# Altium footprint library m-BLANC.PcbLib: 53 footprints (part 2 of 4)
Each footprint in its own frame and in the unit in brackets; x right, y up, seen from the top. Pads: shape width x height; smd on the part's side, far side on the other; paste and mask are expansions set on the pad; w line width, h text height; cw(c..) or ccw(c..) is an arc to the next point about the centre after c.
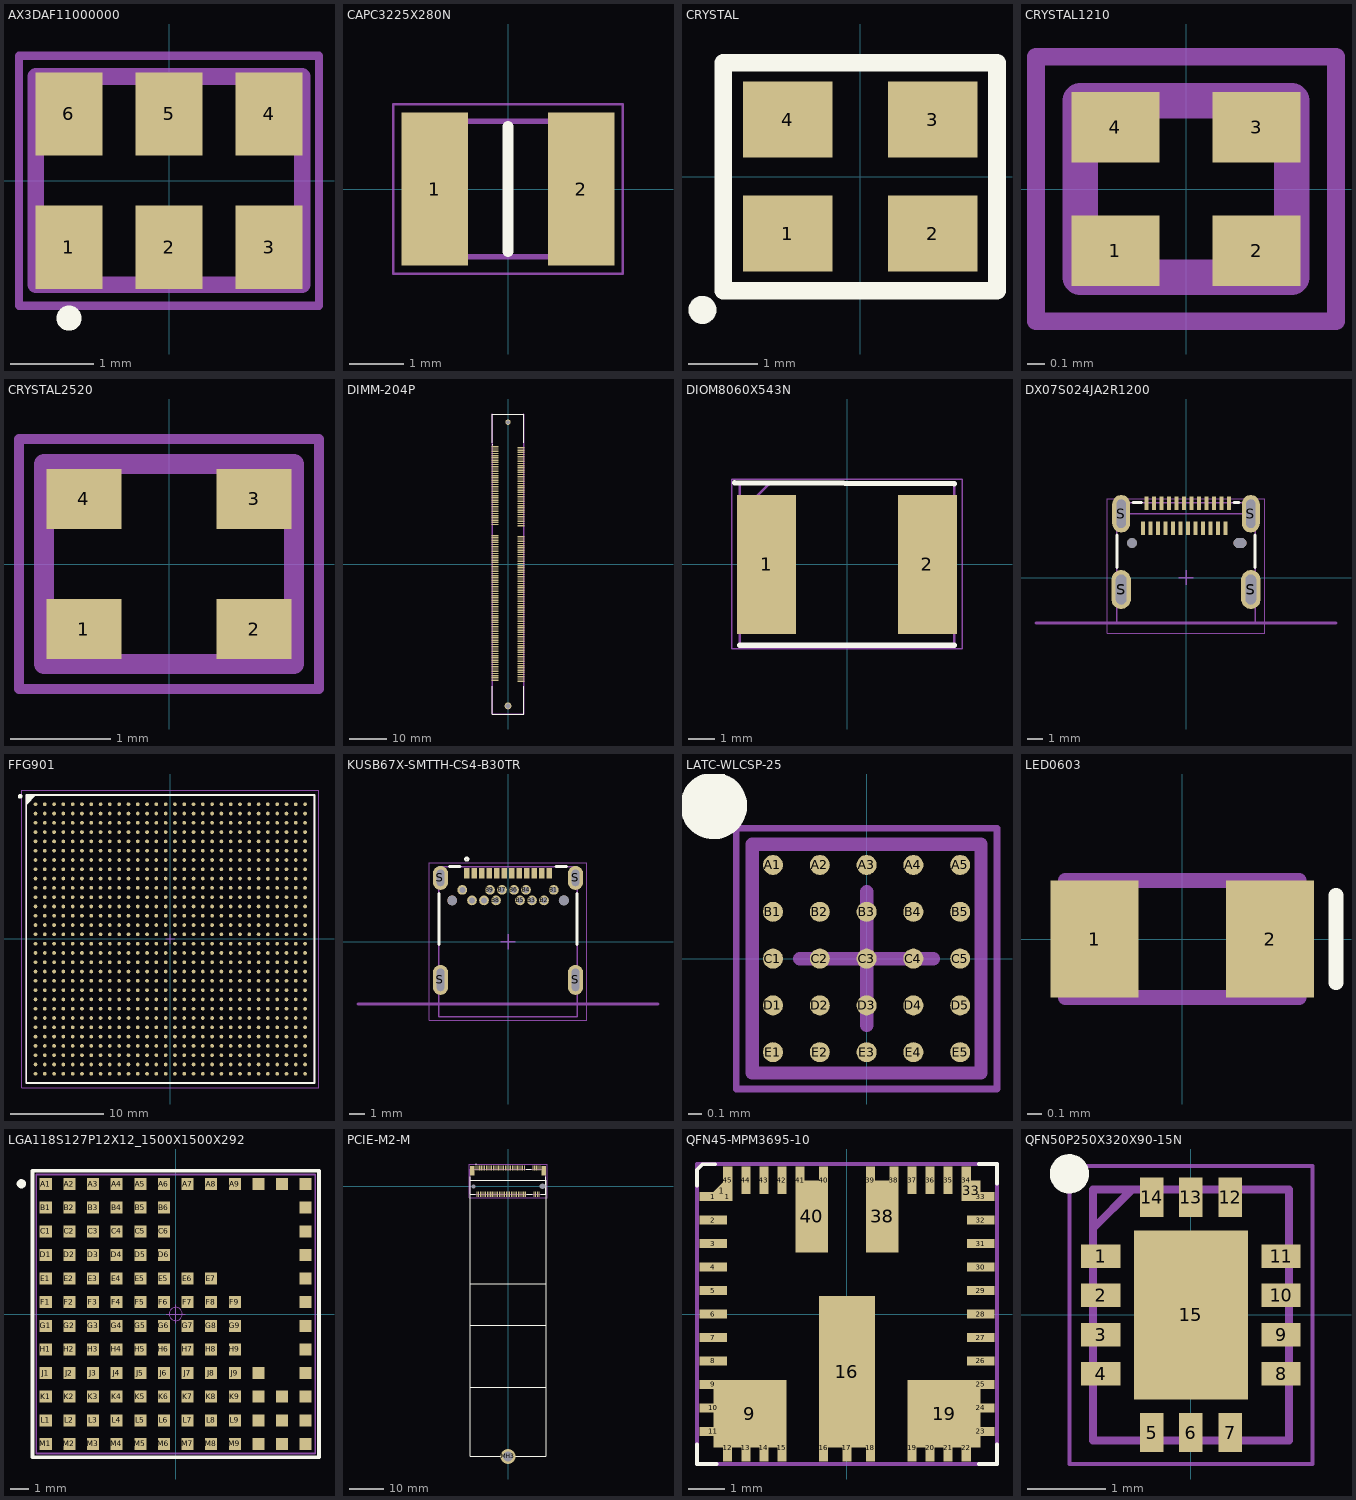
[diagram p1: the footprints below, top view; thin cyan lines are the x and y axes]

## AX3DAF11000000 [mm]
pads (6):
  rect 0.8x1 smd: 1(-1.2,-0.8) 2(0,-0.8) 3(1.2,-0.8) 4(1.2,0.8) 5(0,0.8) 6(-1.2,0.8)
Top Overlay:
  lines w0.2: -1.2,-1.7 ccw(c-1.2,-1.65) -1.2,-1.6 ccw(c-1.2,-1.65) -1.2,-1.7
Mechanical 13:
  lines w0.2: -1.6,-1.25 -1.6,1.25 1.6,1.25 1.6,-1.25 -1.6,-1.25
Mechanical 15:
  lines w0.1: -1.8,-1.5 -1.8,1.5 1.8,1.5 1.8,-1.5 -1.8,-1.5
3D body "AX3DAF1-100.0000.stp": height 1.2, standoff 0, extent -1.6,-1.26 1.6,1.26

## CAPC3225X280N [mm]
pads (2):
  rect 1.22x2.82 smd: 1(-1.35,0) 2(1.35,0)
Top Overlay:
  lines w0.2: 0,-1.15 0,1.15
Mechanical 13:
  lines w0.1: -1.6,-1.25 -1.6,1.25 1.6,1.25 1.6,-1.25 -1.6,-1.25
Mechanical 15:
  lines w0.05: -2.11,-1.56 -2.11,1.56 2.11,1.56 2.11,-1.56 -2.11,-1.56
3D body "JMK325ABJ107MM-P.stp": height 2.8, standoff 0, extent -1.6,-1.25 1.6,1.25

## CRYSTAL [mm]
pads (4):
  rect 1.3x1.1 smd: 1(-1.05,-0.825) 2(1.05,-0.825) 3(1.05,0.825) 4(-1.05,0.825)
Top Overlay:
  circle w0.25: c-2.286,-1.93 r0.078
  lines w0.254: -1.981,-1.65 -1.981,1.651 1.981,1.651 1.981,-1.65 -1.981,-1.65
3D body "ASE.STEP": height 1.2, standoff 0, extent -1.6,-1.25 1.6,1.25

## CRYSTAL1210 [mm]
pads (4):
  rect 0.5x0.4 smd: 1(-0.4,-0.35) 2(0.4,-0.35) 3(0.4,0.35) 4(-0.4,0.35)
Mechanical 13:
  lines w0.2: -0.6,-0.5 0.6,-0.5 0.6,0.5 -0.6,0.5 -0.6,-0.5
Mechanical 15:
  lines w0.1: -0.85,-0.75 0.85,-0.75 0.85,0.75 -0.85,0.75 -0.85,-0.75
3D body "ABM13W-52.0000MHZ-5-B2G-T5.stp": height 0.5, standoff 0, extent -0.61,-0.51 0.61,0.51

## CRYSTAL2520 [mm]
pads (4):
  rect 0.75x0.6 smd: 1(-0.85,-0.65) 2(0.85,-0.65) 3(0.85,0.65) 4(-0.85,0.65)
Mechanical 13:
  lines w0.2: -1.25,-1 -1.25,1 1.25,1 1.25,-1 -1.25,-1
Mechanical 15:
  lines w0.1: -1.5,-1.25 -1.5,1.25 1.5,1.25 1.5,-1.25 -1.5,-1.25
3D body: height 0.5, standoff 0, extent -1.25,-1 1.25,1

## DIMM-204P [mm]
pads (206):
  rect 2x0.35 smd: 1(-3.5,31.65) 2(3.5,31.35) 3(3.5,30.75) 4(-3.5,31.05) 5(3.5,30.15) 6(-3.5,30.45) 7(3.5,29.55) 8(-3.5,29.85) 9(3.5,28.95) 10(-3.5,29.25) 11(3.5,28.35) 12(-3.5,28.65) 13(3.5,27.75) 14(-3.5,28.05) 15(3.5,27.15) 16(-3.5,27.45) 17(3.5,26.55) 18(-3.5,26.85) 19(3.5,25.95) 20(-3.5,26.25) 21(3.5,25.35) 22(-3.5,25.65) 23(3.5,24.75) 24(-3.5,25.05) 25(3.5,24.15) 26(-3.5,24.45) 27(3.5,23.55) 28(-3.5,23.85) 29(3.5,22.95) 30(-3.5,23.25) 31(3.5,22.35) 32(-3.5,22.65) 33(3.5,21.75) 34(-3.5,22.05) 35(3.5,21.15) 36(-3.5,21.45) 37(3.5,20.55) 38(-3.5,20.85) 39(3.5,19.95) 40(-3.5,20.25) 41(3.5,19.35) 42(-3.5,19.65) 43(3.5,18.75) 44(-3.5,19.05) 45(3.5,18.15) 46(-3.5,18.45) 47(3.5,17.55) 48(-3.5,17.85) 49(3.5,16.95) 50(-3.5,17.25) 51(3.5,16.35) 52(-3.5,16.65) 53(3.5,15.75) 54(-3.5,16.05) 55(3.5,15.15) 56(-3.5,15.45) 57(3.5,14.55) 58(-3.5,14.85) 59(3.5,13.95) 60(-3.5,14.25) 61(3.5,13.35) 62(-3.5,13.65) 63(3.5,12.75) 64(-3.5,13.05) 65(3.5,12.15) 66(-3.5,12.45) 67(3.5,11.55) 68(-3.5,11.85) 69(3.5,10.95) 70(-3.5,11.25) 71(3.5,10.35) 72(-3.5,10.65) 73(-3.5,7.65) 74(3.5,7.35) 75(-3.5,7.05) 76(3.5,6.75) 77(-3.5,6.45) 78(3.5,6.15) 79(-3.5,5.85) 80(3.5,5.55) 81(-3.5,5.25) 82(3.5,4.95) 83(-3.5,4.65) 84(3.5,4.35) 85(-3.5,4.05) 86(3.5,3.75) 87(-3.5,3.45) 88(3.5,3.15) 89(-3.5,2.85) 90(3.5,2.55) 91(-3.5,2.25) 92(3.5,1.95) 93(-3.5,1.65) 94(3.5,1.35) 95(-3.5,1.05) 96(3.5,0.75) 97(-3.5,0.45) 98(3.5,0.15) 99(-3.5,-0.15) 100(3.5,-0.45) 101(-3.5,-0.75) 102(3.5,-1.05) 103(-3.5,-1.35) 104(3.5,-1.65) 105(-3.5,-1.95) 106(3.5,-2.25) 107(-3.5,-2.55) 108(3.5,-2.85) 109(-3.5,-3.15) 110(3.5,-3.45) 111(-3.5,-3.75) 112(3.5,-4.05) 113(-3.5,-4.35) 114(3.5,-4.65) 115(-3.5,-4.95) 116(3.5,-5.25) 117(-3.5,-5.55) 118(3.5,-5.85) 119(-3.5,-6.15) 120(3.5,-6.45) 121(-3.5,-6.75) 122(3.5,-7.05) 123(-3.5,-7.35) 124(3.5,-7.65) 125(-3.5,-7.95) 126(3.5,-8.25) 127(-3.5,-8.55) 128(3.5,-8.85) 129(-3.5,-9.15) 130(3.5,-9.45) 131(-3.5,-9.75) 132(3.5,-10.05) 133(-3.5,-10.35) 134(3.5,-10.65) 135(-3.5,-10.95) 136(3.5,-11.25) 137(-3.5,-11.55) 138(3.5,-11.85) 139(-3.5,-12.15) 140(3.5,-12.45) 141(-3.5,-12.75) 142(3.5,-13.05) 143(-3.5,-13.35) 144(3.5,-13.65) 145(-3.5,-13.95) 146(3.5,-14.25) 147(-3.5,-14.55) 148(3.5,-14.85) 149(-3.5,-15.15) 150(3.5,-15.45) 151(-3.5,-15.75) 152(3.5,-16.05) 153(-3.5,-16.35) 154(3.5,-16.65) 155(-3.5,-16.95) 156(3.5,-17.25) 157(-3.5,-17.55) 158(3.5,-17.85) 159(-3.5,-18.15) 160(3.5,-18.45) 161(-3.5,-18.75) 162(3.5,-19.05) 163(-3.5,-19.35) 164(3.5,-19.65) 165(-3.5,-19.95) 166(3.5,-20.25) 167(-3.5,-20.55) 168(3.5,-20.85) 169(-3.5,-21.15) 170(3.5,-21.45) 171(-3.5,-21.75) 172(3.5,-22.05) 173(-3.5,-22.35) 174(3.5,-22.65) 175(-3.5,-22.95) 176(3.5,-23.25) 177(-3.5,-23.55) 178(3.5,-23.85) 179(-3.5,-24.15) 180(3.5,-24.45) 181(-3.5,-24.75) 182(3.5,-25.05) 183(-3.5,-25.35) 184(3.5,-25.65) 185(-3.5,-25.95) 186(3.5,-26.25) 187(-3.5,-26.55) 188(3.5,-26.85) 189(-3.5,-27.15) 190(3.5,-27.45) 191(-3.5,-27.75) 192(3.5,-28.05) 193(-3.5,-28.35) 194(3.5,-28.65) 195(-3.5,-28.95) 196(3.5,-29.25) 197(-3.5,-29.55) 198(3.5,-29.85) 199(-3.5,-30.15) 200(3.5,-30.45) 201(-3.5,-30.75) 202(3.5,-31.05) 203(-3.5,-31.35) 204(3.5,-31.65)
  round 1.45 hole 1: MH1(0,38.3)
  round 1.85 hole 1.4: MH2(0,-38.3)
Top Overlay:
  circle w0.1: c-4.195,32.208 r0.05
  lines w0.1: -4.203,32.8 -4.203,40.5 4.2,40.5 ; -4.199,-33.02 -4.199,-40.5 4.2,-40.5 ; 4.197,32.8 4.197,40.5 ; 4.201,-40.5 4.201,-33.02
Mechanical 13:
  lines w0.1: -4.2,-40.5 4.2,-40.5 4.2,40.5 -4.2,40.5 -4.2,-40.5
Mechanical 15:
  lines w0.1: -4.2,-40.5 -4.2,40.5 4.2,40.5 4.2,-40.5 -4.2,-40.5
3D body: height 4, standoff 0, extent -4.25,-40.55 4.25,40.55

## DIOM8060X543N [mm]
pads (2):
  rect 2.2x5.2 smd: 1(-3,0) 2(3,0)
Top Overlay:
  lines w0.2: -4.2,3.05 4.008,3.012 ; -4.008,-3.012 4.008,-3.012
Mechanical 13:
  lines w0.1: -4.008,1.912 -2.908,3.012 ; -4.008,-3.012 4.008,-3.012 4.008,3.012 -4.008,3.012 -4.008,-3.012
Mechanical 15:
  lines w0.05: -4.3,-3.15 4.3,-3.15 4.3,3.185 -4.3,3.185 -4.3,-3.15
3D body "SK106-TP.stp": height 5.43, standoff 0, extent -4.008,-3.013 4.008,3.013

## DX07S024JA2R1200 [mm] "Micro USB Receptacle, Type C, Hybrid Type, PCB Top Mount"
height 3.42
pads (30):
  rect 0.25x0.9 smd: A1(-2.628,4.942) A2(-2.128,4.942) A3(-1.628,4.942) A4(-1.128,4.942) A5(-0.628,4.942) A6(-0.128,4.942) A7(0.372,4.942) A8(0.872,4.942) A9(1.372,4.942) A10(1.872,4.942) A11(2.372,4.942) A12(2.872,4.942) B1(2.625,3.297) B2(2.125,3.297) B3(1.625,3.297) B4(1.125,3.297) B5(0.625,3.297) B6(0.125,3.297) B7(-0.375,3.297) B8(-0.875,3.297) B9(-1.375,3.297) B10(-1.875,3.297) B11(-2.375,3.297) B12(-2.875,3.297)
  oval 1.3x2.6 hole 0.7 slot 2 at 90 deg: S(-4.32,-0.8) S(4.32,-0.8)
  oval 1.2x2.5 hole 0.6 slot 1.9 at 90 deg: S(-4.32,4.25) S(4.32,4.25)
  round 0.65 hole 0.65 unplated: ""(-3.6,2.3)
  oval 0.85x0.65 hole 0.65 slot 0.85 at 0 deg unplated: ""(3.6,2.3)
Top Overlay:
  lines w0.2: -4.6,2.85 -4.598,0.657 ; -3.525,5 -2.958,5 ; 3.2,5 3.526,5 ; 4.6,0.662 4.6,2.848
Mechanical 1:
  lines w0.1: -4.32,4.25 4.32,4.25
  lines w0.2: -10,-3.05 10,-3.05
  text "PCB Edge" at -2.05,-2.6 h0.5
Mechanical 13:
  lines w0.1: -4.6,-3.05 -4.6,5 4.6,5 4.6,-3.05
Mechanical 15:
  lines w0.05: -5.25,-3.7 5.25,-3.7 5.25,5.25 -5.25,5.25 -5.25,-3.7
  lines w0.1: -0.5,0 0.5,0 ; 0,-0.5 0,0.5
3D body "K3D-DX07S024JA2-V1_JAE_Proprietary.STEP": height 3.17, standoff -1.17, extent -4.47,-3.1 4.47,5.07

## FFG901 [mm] "BGA, 900-Balls, Body 31x31mm, Pitch 1mm"
height 3.35
pads (900):
  round 0.4 smd: A1(-14.5,14.5) A2(-13.5,14.5) A3(-12.5,14.5) A4(-11.5,14.5) A5(-10.5,14.5) A6(-9.5,14.5) A7(-8.5,14.5) A8(-7.5,14.5) A9(-6.5,14.5) A10(-5.5,14.5) A11(-4.5,14.5) A12(-3.5,14.5) A13(-2.5,14.5) A14(-1.5,14.5) A15(-0.5,14.5) A16(0.5,14.5) A17(1.5,14.5) A18(2.5,14.5) A19(3.5,14.5) A20(4.5,14.5) A21(5.5,14.5) A22(6.5,14.5) A23(7.5,14.5) A24(8.5,14.5) A25(9.5,14.5) A26(10.5,14.5) A27(11.5,14.5) A28(12.5,14.5) A29(13.5,14.5) A30(14.5,14.5) AA1(-14.5,-5.5) AA2(-13.5,-5.5) AA3(-12.5,-5.5) AA4(-11.5,-5.5) AA5(-10.5,-5.5) AA6(-9.5,-5.5) AA7(-8.5,-5.5) AA8(-7.5,-5.5) AA9(-6.5,-5.5) AA10(-5.5,-5.5) AA11(-4.5,-5.5) AA12(-3.5,-5.5) AA13(-2.5,-5.5) AA14(-1.5,-5.5) AA15(-0.5,-5.5) AA16(0.5,-5.5) AA17(1.5,-5.5) AA18(2.5,-5.5) AA19(3.5,-5.5) AA20(4.5,-5.5) AA21(5.5,-5.5) AA22(6.5,-5.5) AA23(7.5,-5.5) AA24(8.5,-5.5) AA25(9.5,-5.5) AA26(10.5,-5.5) AA27(11.5,-5.5) AA28(12.5,-5.5) AA29(13.5,-5.5) AA30(14.5,-5.5) AB1(-14.5,-6.5) AB2(-13.5,-6.5) AB3(-12.5,-6.5) AB4(-11.5,-6.5) AB5(-10.5,-6.5) AB6(-9.5,-6.5) AB7(-8.5,-6.5) AB8(-7.5,-6.5) AB9(-6.5,-6.5) AB10(-5.5,-6.5) AB11(-4.5,-6.5) AB12(-3.5,-6.5) AB13(-2.5,-6.5) AB14(-1.5,-6.5) AB15(-0.5,-6.5) AB16(0.5,-6.5) AB17(1.5,-6.5) AB18(2.5,-6.5) AB19(3.5,-6.5) AB20(4.5,-6.5) AB21(5.5,-6.5) AB22(6.5,-6.5) AB23(7.5,-6.5) AB24(8.5,-6.5) AB25(9.5,-6.5) AB26(10.5,-6.5) AB27(11.5,-6.5) AB28(12.5,-6.5) AB29(13.5,-6.5) AB30(14.5,-6.5) AC1(-14.5,-7.5) AC2(-13.5,-7.5) AC3(-12.5,-7.5) AC4(-11.5,-7.5) AC5(-10.5,-7.5) AC6(-9.5,-7.5) AC7(-8.5,-7.5) AC8(-7.5,-7.5) AC9(-6.5,-7.5) AC10(-5.5,-7.5) AC11(-4.5,-7.5) AC12(-3.5,-7.5) AC13(-2.5,-7.5) AC14(-1.5,-7.5) AC15(-0.5,-7.5) AC16(0.5,-7.5) AC17(1.5,-7.5) AC18(2.5,-7.5) AC19(3.5,-7.5) AC20(4.5,-7.5) AC21(5.5,-7.5) AC22(6.5,-7.5) AC23(7.5,-7.5) AC24(8.5,-7.5) AC25(9.5,-7.5) AC26(10.5,-7.5) AC27(11.5,-7.5) AC28(12.5,-7.5) AC29(13.5,-7.5) AC30(14.5,-7.5) AD1(-14.5,-8.5) AD2(-13.5,-8.5) AD3(-12.5,-8.5) AD4(-11.5,-8.5) AD5(-10.5,-8.5) AD6(-9.5,-8.5) AD7(-8.5,-8.5) AD8(-7.5,-8.5) AD9(-6.5,-8.5) AD10(-5.5,-8.5) AD11(-4.5,-8.5) AD12(-3.5,-8.5) AD13(-2.5,-8.5) AD14(-1.5,-8.5) AD15(-0.5,-8.5) AD16(0.5,-8.5) AD17(1.5,-8.5) AD18(2.5,-8.5) AD19(3.5,-8.5) AD20(4.5,-8.5) AD21(5.5,-8.5) AD22(6.5,-8.5) AD23(7.5,-8.5) AD24(8.5,-8.5) AD25(9.5,-8.5) AD26(10.5,-8.5) AD27(11.5,-8.5) AD28(12.5,-8.5) AD29(13.5,-8.5) AD30(14.5,-8.5) AE1(-14.5,-9.5) AE2(-13.5,-9.5) AE3(-12.5,-9.5) AE4(-11.5,-9.5) AE5(-10.5,-9.5) AE6(-9.5,-9.5) AE7(-8.5,-9.5) AE8(-7.5,-9.5) AE9(-6.5,-9.5) AE10(-5.5,-9.5) AE11(-4.5,-9.5) AE12(-3.5,-9.5) AE13(-2.5,-9.5) AE14(-1.5,-9.5) AE15(-0.5,-9.5) AE16(0.5,-9.5) AE17(1.5,-9.5) AE18(2.5,-9.5) AE19(3.5,-9.5) AE20(4.5,-9.5) AE21(5.5,-9.5) AE22(6.5,-9.5) AE23(7.5,-9.5) AE24(8.5,-9.5) AE25(9.5,-9.5) AE26(10.5,-9.5) AE27(11.5,-9.5) AE28(12.5,-9.5) AE29(13.5,-9.5) AE30(14.5,-9.5) AF1(-14.5,-10.5) AF2(-13.5,-10.5) AF3(-12.5,-10.5) AF4(-11.5,-10.5) AF5(-10.5,-10.5) AF6(-9.5,-10.5) AF7(-8.5,-10.5) AF8(-7.5,-10.5) AF9(-6.5,-10.5) AF10(-5.5,-10.5) AF11(-4.5,-10.5) AF12(-3.5,-10.5) AF13(-2.5,-10.5) AF14(-1.5,-10.5) AF15(-0.5,-10.5) AF16(0.5,-10.5) AF17(1.5,-10.5) AF18(2.5,-10.5) AF19(3.5,-10.5) AF20(4.5,-10.5) AF21(5.5,-10.5) AF22(6.5,-10.5) AF23(7.5,-10.5) AF24(8.5,-10.5) AF25(9.5,-10.5) AF26(10.5,-10.5) AF27(11.5,-10.5) AF28(12.5,-10.5) AF29(13.5,-10.5) AF30(14.5,-10.5) AG1(-14.5,-11.5) AG2(-13.5,-11.5) AG3(-12.5,-11.5) AG4(-11.5,-11.5) AG5(-10.5,-11.5) AG6(-9.5,-11.5) AG7(-8.5,-11.5) AG8(-7.5,-11.5) AG9(-6.5,-11.5) AG10(-5.5,-11.5) AG11(-4.5,-11.5) AG12(-3.5,-11.5) AG13(-2.5,-11.5) AG14(-1.5,-11.5) AG15(-0.5,-11.5) AG16(0.5,-11.5) AG17(1.5,-11.5) AG18(2.5,-11.5) AG19(3.5,-11.5) AG20(4.5,-11.5) AG21(5.5,-11.5) AG22(6.5,-11.5) AG23(7.5,-11.5) AG24(8.5,-11.5) AG25(9.5,-11.5) AG26(10.5,-11.5) AG27(11.5,-11.5) AG28(12.5,-11.5) AG29(13.5,-11.5) AG30(14.5,-11.5) AH1(-14.5,-12.5) AH2(-13.5,-12.5) AH3(-12.5,-12.5) AH4(-11.5,-12.5) AH5(-10.5,-12.5) AH6(-9.5,-12.5) AH7(-8.5,-12.5) AH8(-7.5,-12.5) AH9(-6.5,-12.5) AH10(-5.5,-12.5) AH11(-4.5,-12.5) AH12(-3.5,-12.5) AH13(-2.5,-12.5) AH14(-1.5,-12.5) AH15(-0.5,-12.5) AH16(0.5,-12.5) AH17(1.5,-12.5) AH18(2.5,-12.5) AH19(3.5,-12.5) AH20(4.5,-12.5) AH21(5.5,-12.5) AH22(6.5,-12.5) AH23(7.5,-12.5) AH24(8.5,-12.5) AH25(9.5,-12.5) AH26(10.5,-12.5) AH27(11.5,-12.5) AH28(12.5,-12.5) AH29(13.5,-12.5) AH30(14.5,-12.5) AJ1(-14.5,-13.5) AJ2(-13.5,-13.5) AJ3(-12.5,-13.5) AJ4(-11.5,-13.5) AJ5(-10.5,-13.5) AJ6(-9.5,-13.5) AJ7(-8.5,-13.5) AJ8(-7.5,-13.5) AJ9(-6.5,-13.5) AJ10(-5.5,-13.5) AJ11(-4.5,-13.5) AJ12(-3.5,-13.5) AJ13(-2.5,-13.5) AJ14(-1.5,-13.5) AJ15(-0.5,-13.5) AJ16(0.5,-13.5) AJ17(1.5,-13.5) AJ18(2.5,-13.5) AJ19(3.5,-13.5) AJ20(4.5,-13.5) AJ21(5.5,-13.5) AJ22(6.5,-13.5) AJ23(7.5,-13.5) AJ24(8.5,-13.5) AJ25(9.5,-13.5) AJ26(10.5,-13.5) AJ27(11.5,-13.5) AJ28(12.5,-13.5) AJ29(13.5,-13.5) AJ30(14.5,-13.5) AK1(-14.5,-14.5) AK2(-13.5,-14.5) AK3(-12.5,-14.5) AK4(-11.5,-14.5) AK5(-10.5,-14.5) AK6(-9.5,-14.5) AK7(-8.5,-14.5) AK8(-7.5,-14.5) AK9(-6.5,-14.5) AK10(-5.5,-14.5) AK11(-4.5,-14.5) AK12(-3.5,-14.5) AK13(-2.5,-14.5) AK14(-1.5,-14.5) AK15(-0.5,-14.5) AK16(0.5,-14.5) AK17(1.5,-14.5) AK18(2.5,-14.5) AK19(3.5,-14.5) AK20(4.5,-14.5) AK21(5.5,-14.5) AK22(6.5,-14.5) AK23(7.5,-14.5) AK24(8.5,-14.5) AK25(9.5,-14.5) AK26(10.5,-14.5) AK27(11.5,-14.5) AK28(12.5,-14.5) AK29(13.5,-14.5) AK30(14.5,-14.5) B1(-14.5,13.5) B2(-13.5,13.5) B3(-12.5,13.5) B4(-11.5,13.5) B5(-10.5,13.5) B6(-9.5,13.5) B7(-8.5,13.5) B8(-7.5,13.5) B9(-6.5,13.5) B10(-5.5,13.5) B11(-4.5,13.5) B12(-3.5,13.5) B13(-2.5,13.5) B14(-1.5,13.5) B15(-0.5,13.5) B16(0.5,13.5) B17(1.5,13.5) B18(2.5,13.5) B19(3.5,13.5) B20(4.5,13.5) B21(5.5,13.5) B22(6.5,13.5) B23(7.5,13.5) B24(8.5,13.5) B25(9.5,13.5) B26(10.5,13.5) B27(11.5,13.5) B28(12.5,13.5) B29(13.5,13.5) B30(14.5,13.5) C1(-14.5,12.5) C2(-13.5,12.5) C3(-12.5,12.5) C4(-11.5,12.5) C5(-10.5,12.5) C6(-9.5,12.5) C7(-8.5,12.5) C8(-7.5,12.5) C9(-6.5,12.5) C10(-5.5,12.5) C11(-4.5,12.5) C12(-3.5,12.5) C13(-2.5,12.5) C14(-1.5,12.5) C15(-0.5,12.5) C16(0.5,12.5) C17(1.5,12.5) C18(2.5,12.5) C19(3.5,12.5) C20(4.5,12.5) C21(5.5,12.5) C22(6.5,12.5) C23(7.5,12.5) C24(8.5,12.5) C25(9.5,12.5) C26(10.5,12.5) C27(11.5,12.5) C28(12.5,12.5) C29(13.5,12.5) C30(14.5,12.5) D1(-14.5,11.5) D2(-13.5,11.5) D3(-12.5,11.5) D4(-11.5,11.5) D5(-10.5,11.5) D6(-9.5,11.5) D7(-8.5,11.5) D8(-7.5,11.5) D9(-6.5,11.5) D10(-5.5,11.5) D11(-4.5,11.5) D12(-3.5,11.5) D13(-2.5,11.5) D14(-1.5,11.5) D15(-0.5,11.5) D16(0.5,11.5) D17(1.5,11.5) D18(2.5,11.5) D19(3.5,11.5) D20(4.5,11.5) D21(5.5,11.5) D22(6.5,11.5) D23(7.5,11.5) D24(8.5,11.5) D25(9.5,11.5) D26(10.5,11.5) D27(11.5,11.5) D28(12.5,11.5) D29(13.5,11.5) D30(14.5,11.5) E1(-14.5,10.5) E2(-13.5,10.5) E3(-12.5,10.5) E4(-11.5,10.5) E5(-10.5,10.5) E6(-9.5,10.5) E7(-8.5,10.5) E8(-7.5,10.5) E9(-6.5,10.5) E10(-5.5,10.5) E11(-4.5,10.5) E12(-3.5,10.5) E13(-2.5,10.5) E14(-1.5,10.5) E15(-0.5,10.5) E16(0.5,10.5) E17(1.5,10.5) E18(2.5,10.5) E19(3.5,10.5) E20(4.5,10.5) E21(5.5,10.5) E22(6.5,10.5) E23(7.5,10.5) E24(8.5,10.5) E25(9.5,10.5) E26(10.5,10.5) E27(11.5,10.5) E28(12.5,10.5) E29(13.5,10.5) E30(14.5,10.5) F1(-14.5,9.5) F2(-13.5,9.5) F3(-12.5,9.5) F4(-11.5,9.5) F5(-10.5,9.5) F6(-9.5,9.5) F7(-8.5,9.5) F8(-7.5,9.5) F9(-6.5,9.5) F10(-5.5,9.5) F11(-4.5,9.5) F12(-3.5,9.5) F13(-2.5,9.5) F14(-1.5,9.5) F15(-0.5,9.5) F16(0.5,9.5) F17(1.5,9.5) F18(2.5,9.5) F19(3.5,9.5) F20(4.5,9.5) F21(5.5,9.5) F22(6.5,9.5) F23(7.5,9.5) F24(8.5,9.5) F25(9.5,9.5) F26(10.5,9.5) F27(11.5,9.5) F28(12.5,9.5) F29(13.5,9.5) F30(14.5,9.5) G1(-14.5,8.5) G2(-13.5,8.5) G3(-12.5,8.5) G4(-11.5,8.5) G5(-10.5,8.5) G6(-9.5,8.5) G7(-8.5,8.5) G8(-7.5,8.5) G9(-6.5,8.5) G10(-5.5,8.5) G11(-4.5,8.5) G12(-3.5,8.5) G13(-2.5,8.5) G14(-1.5,8.5) G15(-0.5,8.5) G16(0.5,8.5) G17(1.5,8.5) G18(2.5,8.5) G19(3.5,8.5) G20(4.5,8.5) G21(5.5,8.5) G22(6.5,8.5) G23(7.5,8.5) G24(8.5,8.5) G25(9.5,8.5) G26(10.5,8.5) G27(11.5,8.5) G28(12.5,8.5) G29(13.5,8.5) G30(14.5,8.5) H1(-14.5,7.5) H2(-13.5,7.5) H3(-12.5,7.5) H4(-11.5,7.5) H5(-10.5,7.5) H6(-9.5,7.5) H7(-8.5,7.5) H8(-7.5,7.5) H9(-6.5,7.5) H10(-5.5,7.5) H11(-4.5,7.5) H12(-3.5,7.5) H13(-2.5,7.5) H14(-1.5,7.5) H15(-0.5,7.5) H16(0.5,7.5) H17(1.5,7.5) H18(2.5,7.5) H19(3.5,7.5) H20(4.5,7.5) H21(5.5,7.5) H22(6.5,7.5) H23(7.5,7.5) H24(8.5,7.5) H25(9.5,7.5) H26(10.5,7.5) H27(11.5,7.5) H28(12.5,7.5) H29(13.5,7.5) H30(14.5,7.5) J1(-14.5,6.5) J2(-13.5,6.5) J3(-12.5,6.5) J4(-11.5,6.5) J5(-10.5,6.5) J6(-9.5,6.5) J7(-8.5,6.5) J8(-7.5,6.5) J9(-6.5,6.5) J10(-5.5,6.5) J11(-4.5,6.5) J12(-3.5,6.5) J13(-2.5,6.5) J14(-1.5,6.5) J15(-0.5,6.5) J16(0.5,6.5) J17(1.5,6.5) J18(2.5,6.5) J19(3.5,6.5) J20(4.5,6.5) J21(5.5,6.5) J22(6.5,6.5) J23(7.5,6.5) J24(8.5,6.5) J25(9.5,6.5) J26(10.5,6.5) J27(11.5,6.5) J28(12.5,6.5) J29(13.5,6.5) J30(14.5,6.5) K1(-14.5,5.5) K2(-13.5,5.5) K3(-12.5,5.5) K4(-11.5,5.5) K5(-10.5,5.5) K6(-9.5,5.5) K7(-8.5,5.5) K8(-7.5,5.5) K9(-6.5,5.5) K10(-5.5,5.5) K11(-4.5,5.5) K12(-3.5,5.5) K13(-2.5,5.5) K14(-1.5,5.5) K15(-0.5,5.5) K16(0.5,5.5) K17(1.5,5.5) K18(2.5,5.5) K19(3.5,5.5) K20(4.5,5.5) K21(5.5,5.5) K22(6.5,5.5) K23(7.5,5.5) K24(8.5,5.5) K25(9.5,5.5) K26(10.5,5.5) K27(11.5,5.5) K28(12.5,5.5) K29(13.5,5.5) K30(14.5,5.5) L1(-14.5,4.5) L2(-13.5,4.5) L3(-12.5,4.5) L4(-11.5,4.5) L5(-10.5,4.5) L6(-9.5,4.5) L7(-8.5,4.5) L8(-7.5,4.5) L9(-6.5,4.5) L10(-5.5,4.5) L11(-4.5,4.5) L12(-3.5,4.5) L13(-2.5,4.5) L14(-1.5,4.5) L15(-0.5,4.5) L16(0.5,4.5) L17(1.5,4.5) L18(2.5,4.5) L19(3.5,4.5) L20(4.5,4.5) L21(5.5,4.5) L22(6.5,4.5) L23(7.5,4.5) L24(8.5,4.5) L25(9.5,4.5) L26(10.5,4.5) L27(11.5,4.5) L28(12.5,4.5) L29(13.5,4.5) L30(14.5,4.5) M1(-14.5,3.5) M2(-13.5,3.5) M3(-12.5,3.5) M4(-11.5,3.5) M5(-10.5,3.5) M6(-9.5,3.5) M7(-8.5,3.5) M8(-7.5,3.5) M9(-6.5,3.5) M10(-5.5,3.5) M11(-4.5,3.5) M12(-3.5,3.5) M13(-2.5,3.5) M14(-1.5,3.5) M15(-0.5,3.5) M16(0.5,3.5) M17(1.5,3.5) M18(2.5,3.5) M19(3.5,3.5) M20(4.5,3.5) M21(5.5,3.5) M22(6.5,3.5) M23(7.5,3.5) M24(8.5,3.5) M25(9.5,3.5) M26(10.5,3.5) M27(11.5,3.5) M28(12.5,3.5) M29(13.5,3.5) M30(14.5,3.5) N1(-14.5,2.5) N2(-13.5,2.5) N3(-12.5,2.5) N4(-11.5,2.5) N5(-10.5,2.5) N6(-9.5,2.5) N7(-8.5,2.5) N8(-7.5,2.5) N9(-6.5,2.5) N10(-5.5,2.5) N11(-4.5,2.5) N12(-3.5,2.5) N13(-2.5,2.5) N14(-1.5,2.5) N15(-0.5,2.5) N16(0.5,2.5) N17(1.5,2.5) N18(2.5,2.5) N19(3.5,2.5) N20(4.5,2.5) N21(5.5,2.5) N22(6.5,2.5) N23(7.5,2.5) N24(8.5,2.5) N25(9.5,2.5) N26(10.5,2.5) N27(11.5,2.5) N28(12.5,2.5) N29(13.5,2.5) N30(14.5,2.5) P1(-14.5,1.5) P2(-13.5,1.5) P3(-12.5,1.5) P4(-11.5,1.5) P5(-10.5,1.5) P6(-9.5,1.5) P7(-8.5,1.5) P8(-7.5,1.5) P9(-6.5,1.5) P10(-5.5,1.5) P11(-4.5,1.5) P12(-3.5,1.5) P13(-2.5,1.5) P14(-1.5,1.5) P15(-0.5,1.5) P16(0.5,1.5) P17(1.5,1.5) P18(2.5,1.5) P19(3.5,1.5) P20(4.5,1.5) P21(5.5,1.5) P22(6.5,1.5) P23(7.5,1.5) P24(8.5,1.5) P25(9.5,1.5) P26(10.5,1.5) P27(11.5,1.5) P28(12.5,1.5) P29(13.5,1.5) P30(14.5,1.5) R1(-14.5,0.5) R2(-13.5,0.5) R3(-12.5,0.5) R4(-11.5,0.5) R5(-10.5,0.5) R6(-9.5,0.5) R7(-8.5,0.5) R8(-7.5,0.5) R9(-6.5,0.5) R10(-5.5,0.5) R11(-4.5,0.5) R12(-3.5,0.5) R13(-2.5,0.5) R14(-1.5,0.5) R15(-0.5,0.5) R16(0.5,0.5) R17(1.5,0.5) R18(2.5,0.5) R19(3.5,0.5) R20(4.5,0.5) R21(5.5,0.5) R22(6.5,0.5) R23(7.5,0.5) R24(8.5,0.5) R25(9.5,0.5) R26(10.5,0.5) R27(11.5,0.5) R28(12.5,0.5) R29(13.5,0.5) R30(14.5,0.5) T1(-14.5,-0.5) T2(-13.5,-0.5) T3(-12.5,-0.5) T4(-11.5,-0.5) T5(-10.5,-0.5) T6(-9.5,-0.5) T7(-8.5,-0.5) T8(-7.5,-0.5) T9(-6.5,-0.5) T10(-5.5,-0.5) T11(-4.5,-0.5) T12(-3.5,-0.5) T13(-2.5,-0.5) T14(-1.5,-0.5) T15(-0.5,-0.5) T16(0.5,-0.5) T17(1.5,-0.5) T18(2.5,-0.5) T19(3.5,-0.5) T20(4.5,-0.5) T21(5.5,-0.5) T22(6.5,-0.5) T23(7.5,-0.5) T24(8.5,-0.5) T25(9.5,-0.5) T26(10.5,-0.5) T27(11.5,-0.5) T28(12.5,-0.5) T29(13.5,-0.5) T30(14.5,-0.5) U1(-14.5,-1.5) U2(-13.5,-1.5) U3(-12.5,-1.5) U4(-11.5,-1.5) U5(-10.5,-1.5) U6(-9.5,-1.5) U7(-8.5,-1.5) U8(-7.5,-1.5) U9(-6.5,-1.5) U10(-5.5,-1.5) U11(-4.5,-1.5) U12(-3.5,-1.5) U13(-2.5,-1.5) U14(-1.5,-1.5) U15(-0.5,-1.5) U16(0.5,-1.5) U17(1.5,-1.5) U18(2.5,-1.5) U19(3.5,-1.5) U20(4.5,-1.5) U21(5.5,-1.5) U22(6.5,-1.5) U23(7.5,-1.5) U24(8.5,-1.5) U25(9.5,-1.5) U26(10.5,-1.5) U27(11.5,-1.5) U28(12.5,-1.5) U29(13.5,-1.5) U30(14.5,-1.5) V1(-14.5,-2.5) V2(-13.5,-2.5) V3(-12.5,-2.5) V4(-11.5,-2.5) V5(-10.5,-2.5) V6(-9.5,-2.5) V7(-8.5,-2.5) V8(-7.5,-2.5) V9(-6.5,-2.5) V10(-5.5,-2.5) V11(-4.5,-2.5) V12(-3.5,-2.5) V13(-2.5,-2.5) V14(-1.5,-2.5) V15(-0.5,-2.5) V16(0.5,-2.5) V17(1.5,-2.5) V18(2.5,-2.5) V19(3.5,-2.5) V20(4.5,-2.5) V21(5.5,-2.5) V22(6.5,-2.5) V23(7.5,-2.5) V24(8.5,-2.5) V25(9.5,-2.5) V26(10.5,-2.5) V27(11.5,-2.5) V28(12.5,-2.5) V29(13.5,-2.5) V30(14.5,-2.5) W1(-14.5,-3.5) W2(-13.5,-3.5) W3(-12.5,-3.5) W4(-11.5,-3.5) W5(-10.5,-3.5) W6(-9.5,-3.5) W7(-8.5,-3.5) W8(-7.5,-3.5) W9(-6.5,-3.5) W10(-5.5,-3.5) W11(-4.5,-3.5) W12(-3.5,-3.5) W13(-2.5,-3.5) W14(-1.5,-3.5) W15(-0.5,-3.5) W16(0.5,-3.5) W17(1.5,-3.5) W18(2.5,-3.5) W19(3.5,-3.5) W20(4.5,-3.5) W21(5.5,-3.5) W22(6.5,-3.5) W23(7.5,-3.5) W24(8.5,-3.5) W25(9.5,-3.5) W26(10.5,-3.5) W27(11.5,-3.5) W28(12.5,-3.5) W29(13.5,-3.5) W30(14.5,-3.5) Y1(-14.5,-4.5) Y2(-13.5,-4.5) Y3(-12.5,-4.5) Y4(-11.5,-4.5) Y5(-10.5,-4.5) Y6(-9.5,-4.5) Y7(-8.5,-4.5) Y8(-7.5,-4.5) Y9(-6.5,-4.5) Y10(-5.5,-4.5) Y11(-4.5,-4.5) Y12(-3.5,-4.5) Y13(-2.5,-4.5) Y14(-1.5,-4.5) Y15(-0.5,-4.5) Y16(0.5,-4.5) Y17(1.5,-4.5) Y18(2.5,-4.5) Y19(3.5,-4.5) Y20(4.5,-4.5) Y21(5.5,-4.5) Y22(6.5,-4.5) Y23(7.5,-4.5) Y24(8.5,-4.5) Y25(9.5,-4.5) Y26(10.5,-4.5) Y27(11.5,-4.5) Y28(12.5,-4.5) Y29(13.5,-4.5) Y30(14.5,-4.5)
Top Overlay:
  circle w0.25: c-16.15,15.35 r0.125
  region: -14.5,15.5 -15.5,14.5 -15.5,15.5
  lines w0.2: -15.5,14.5 -14.5,15.5 ; -15.5,-15.5 -15.5,15.5 15.5,15.5 15.5,-15.5 -15.5,-15.5
Mechanical 13:
  lines w0.1: -15.5,-15.5 -15.5,15.5 15.5,15.5 15.5,-15.5 -15.5,-15.5
Mechanical 15:
  lines w0.05: -16,-16 -16,16 16,16 16,-16 -16,-16
  lines w0.1: -0.5,0 0.5,0 ; 0,-0.5 0,0.5
3D body: height 2.7, standoff 0, extent -15.6,-15.6 15.6,15.6

## KUSB67X-SMTTH-CS4-B30TR [mm] "Micro USB Receptacle, Type C, Hybrid Type, PCB Top Mount"
height 3.42
pads (30):
  rect 0.35x0.7 smd: A1(-2.75,4.57) A2(-2.25,4.57) A3(-1.75,4.57) A4(-1.25,4.57) A5(-0.75,4.57) A6(-0.25,4.57) A7(0.25,4.57) A8(0.75,4.57) A9(1.25,4.57) A10(1.75,4.57) A11(2.25,4.57) A12(2.75,4.57)
  round 0.65 hole 0.4: B1(3.05,3.45) B2(2.4,2.75) B3(1.6,2.75) B4(1.2,3.45) B5(0.8,2.75) B6(0.4,3.45) B7(-0.4,3.45) B8(-0.8,2.75) B9(-1.2,3.45) B10(-1.6,2.75) B11(-2.4,2.75) B12(-3.05,3.45)
  oval 1x2 hole 0.5 slot 1.5 at 90 deg: S(-4.5,-2.55) S(4.5,-2.55)
  oval 1x1.6 hole 0.5 slot 1.1 at 90 deg: S(-4.5,4.25) S(4.5,4.25)
  round 0.65 hole 0.65 unplated: ""(-3.725,2.75) ""(3.725,2.75)
Top Overlay:
  circle w0.15: c-2.75,5.5 r0.1
  lines w0.2: -4.6,-0.2 -4.6,3.2 ; -3.9,5 -3.2,5 ; 3.2,5 3.9,5 ; 4.6,-0.2 4.6,3.2
Mechanical 1:
  lines w0.2: -10,-4.15 10,-4.15
  text "PCB Edge" at -10,-3.35 h0.5
Mechanical 13:
  lines w0.1: -4.6,-5 4.6,-5 4.6,5 -4.6,5 -4.6,-5
Mechanical 15:
  lines w0.05: -5.25,-5.25 -5.25,5.25 5.25,5.25 5.25,-5.25 -5.25,-5.25
  lines w0.1: -0.5,0 0.5,0 ; 0,-0.5 0,0.5
3D body "usb4055-30-a_reva.step": height 3.5, standoff -1.16, extent -4.856,-5 4.856,5

## LATC-WLCSP-25 [mm] "BGA, 25-Balls, Body 1.71x1.71mm, Pitch 0.35mm"
height 0.5
pads (25):
  round 0.15 smd: A1(-0.7,0.7) A2(-0.35,0.7) A3(0,0.7) A4(0.35,0.7) A5(0.7,0.7) B1(-0.7,0.35) B2(-0.35,0.35) B3(0,0.35) B4(0.35,0.35) B5(0.7,0.35) C1(-0.7,0) C2(-0.35,0) C3(0,0) C4(0.35,0) C5(0.7,0) D1(-0.7,-0.35) D2(-0.35,-0.35) D3(0,-0.35) D4(0.35,-0.35) D5(0.7,-0.35) E1(-0.7,-0.7) E2(-0.35,-0.7) E3(0,-0.7) E4(0.35,-0.7) E5(0.7,-0.7)
Top Overlay:
  circle w0.25: c-1.143,1.143 r0.125
Mechanical 13:
  lines w0.1: -0.855,-0.855 -0.855,0.855 0.855,0.855 0.855,-0.855 -0.855,-0.855
Mechanical 15:
  lines w0.05: -0.975,-0.975 -0.975,0.975 0.975,0.975 0.975,-0.975 -0.975,-0.975
  lines w0.1: -0.5,0 0.5,0 ; 0,-0.5 0,0.5
3D body: height 0.5, standoff 0, extent -1.393,-1 1,1.393

## LED0603 [mm]
pads (2):
  rect 0.6x0.8 smd: 1(-0.6,0) 2(0.6,0)
Top Overlay:
  lines w0.1: 1.05,-0.3 1.05,0.3
Mechanical 13:
  lines w0.1: -0.8,-0.4 0.8,-0.4 0.8,0.4 -0.8,0.4 -0.8,-0.4
Mechanical 15:
  lines w0.05: -0.8,-0.4 0.8,-0.4 0.8,0.4 -0.8,0.4 -0.8,-0.4
3D body: height 0.65, standoff 0, extent -0.8,-0.4 0.8,0.4

## LGA118S127P12X12_1500X1500X292 [mm]
pads (119):
  rect 0.65x0.65 smd: A1(-6.985,6.985) A2(-5.715,6.985) A3(-4.445,6.985) A4(-3.175,6.985) A5(-1.905,6.985) A6(-0.635,6.985) A7(0.635,6.985) A8(1.905,6.985) A9(3.175,6.985) A10(4.445,6.985) A11(5.715,6.985) A12(6.985,6.985) B1(-6.985,5.715) B2(-5.715,5.715) B3(-4.445,5.715) B4(-3.175,5.715) B5(-1.905,5.715) B6(-0.635,5.715) B12(6.985,5.715) C1(-6.985,4.445) C2(-5.715,4.445) C3(-4.445,4.445) C4(-3.175,4.445) C5(-1.905,4.445) C6(-0.635,4.445) C12(6.985,4.445) D1(-6.985,3.175) D2(-5.715,3.175) D3(-4.445,3.175) D4(-3.175,3.175) D5(-1.905,3.175) D6(-0.635,3.175) D12(6.985,3.175) E1(-6.985,1.905) E2(-5.715,1.905) E3(-4.445,1.905) E4(-3.175,1.905) E5(-1.905,1.905) E5(-0.635,1.905) E6(0.635,1.905) E7(1.902,1.907) E12(6.985,1.905) F1(-6.985,0.635) F2(-5.715,0.635) F3(-4.445,0.635) F4(-3.175,0.635) F5(-1.905,0.635) F6(-0.635,0.635) F7(0.635,0.635) F8(1.905,0.635) F9(3.175,0.635) F12(6.985,0.635) G1(-6.985,-0.635) G2(-5.715,-0.635) G3(-4.445,-0.635) G4(-3.175,-0.635) G5(-1.905,-0.635) G6(-0.635,-0.635) G7(0.635,-0.635) G8(1.905,-0.635) G9(3.175,-0.635) G12(6.985,-0.635) H1(-6.985,-1.905) H2(-5.715,-1.905) H3(-4.445,-1.905) H4(-3.175,-1.905) H5(-1.905,-1.905) H6(-0.635,-1.905) H7(0.635,-1.905) H8(1.905,-1.905) H9(3.175,-1.905) H12(6.985,-1.905) J1(-6.985,-3.175) J2(-5.715,-3.175) J3(-4.445,-3.175) J4(-3.175,-3.175) J5(-1.905,-3.175) J6(-0.635,-3.175) J7(0.635,-3.175) J8(1.905,-3.175) J9(3.175,-3.175) J10(4.445,-3.175) J12(6.985,-3.175) K1(-6.985,-4.445) K2(-5.715,-4.445) K3(-4.445,-4.445) K4(-3.175,-4.445) K5(-1.905,-4.445) K6(-0.635,-4.445) K7(0.635,-4.445) K8(1.905,-4.445) K9(3.175,-4.445) K10(4.445,-4.445) K11(5.715,-4.445) K12(6.985,-4.445) L1(-6.985,-5.715) L2(-5.715,-5.715) L3(-4.445,-5.715) L4(-3.175,-5.715) L5(-1.905,-5.715) L6(-0.635,-5.715) L7(0.635,-5.715) L8(1.905,-5.715) L9(3.175,-5.715) L10(4.445,-5.715) L11(5.715,-5.715) L12(6.985,-5.715) M1(-6.985,-6.985) M2(-5.715,-6.985) M3(-4.445,-6.985) M4(-3.175,-6.985) M5(-1.905,-6.985) M6(-0.635,-6.985) M7(0.635,-6.985) M8(1.905,-6.985) M9(3.175,-6.985) M10(4.445,-6.985) M11(5.715,-6.985) M12(6.985,-6.985)
Top Overlay:
  circle w0.25: c-8.3,7 r0.125
  lines w0.2: -7.7,-7.7 7.7,-7.7 7.7,7.7 -7.7,7.7 -7.7,-7.7
Mechanical 13:
  lines w0.1: -7.5,-7.5 7.5,-7.5 7.5,7.5 -7.5,7.5 -7.5,-7.5
Mechanical 15:
  circle w0.05: c0,0 r0.35
  lines w0.001: -7.5,-7.5 7.5,-7.5 7.5,7.5 -7.5,7.5 -7.5,-7.5
  lines w0.05: -0.5,0 0.5,0 ; 0,-0.5 0,0.5 ; -7.7,-7.7 7.7,-7.7 7.7,7.7 -7.7,7.7 -7.7,-7.7
3D body: height 2.82, standoff 0, extent -7.501,-7.51 7.498,7.489

## PCIE-M2-M [mm]
pads (72):
  rect 0.3x1.55 smd: 1(-9.25,5.275) 2(-9,-2.275) 3(-8.75,5.275) 4(-8.5,-2.275) 5(-8.25,5.275) 6(-8,-2.275) 7(-7.75,5.275) 8(-7.5,-2.275) 9(-7.25,5.275) 10(-7,-2.275) 11(-6.75,5.275) 12(-6.5,-2.275) 13(-6.25,5.275) 14(-6,-2.275) 15(-5.75,5.275) 16(-5.5,-2.275) 17(-5.25,5.275) 18(-5,-2.275) 19(-4.75,5.275) 20(-4.5,-2.275) 21(-4.25,5.275) 22(-4,-2.275) 23(-3.75,5.275) 24(-3.5,-2.275) 25(-3.25,5.275) 26(-3,-2.275) 27(-2.75,5.275) 28(-2.5,-2.275) 29(-2.25,5.275) 30(-2,-2.275) 31(-1.75,5.275) 32(-1.5,-2.275) 33(-1.25,5.275) 34(-1,-2.275) 35(-0.75,5.275) 36(-0.5,-2.275) 37(-0.25,5.275) 38(0,-2.275) 39(0.25,5.275) 40(0.5,-2.275) 41(0.75,5.275) 42(1,-2.275) 43(1.25,5.275) 44(1.5,-2.275) 45(1.75,5.275) 46(2,-2.275) 47(2.25,5.275) 48(2.5,-2.275) 49(2.75,5.275) 50(3,-2.275) 51(3.25,5.275) 52(3.5,-2.275) 53(3.75,5.275) 54(4,-2.275) 55(4.25,5.275) 56(4.5,-2.275) 57(4.75,5.275) 58(5,-2.275) 67(7.25,5.275) 68(7.5,-2.275) 69(7.75,5.275) 70(8,-2.275) 71(8.25,5.275) 72(8.5,-2.275) 73(8.75,5.275) 74(9,-2.275) 75(9.25,5.275)
  round 0.575 hole 1.15 unplated: MH1(-10,0)
  round 0.825 hole 1.65 unplated: MH2(10,0)
  oval 4.35x4.25 hole 2.8: MH3(0,-78.25)
  rect 1.2x2.75 smd: MP1(-10.35,4.5) MP2(10.35,4.5)
Top Overlay:
  lines w0.1: -11,2.75 -11,-2.275 -9.5,-2.275 ; 5.25,5 6.75,5 ; 5.5,-2.275 7,-2.275 ; 9.5,-2.275 11,-2.275 11,2.75 ; -9.3,6.4 ccw(c-9.25,6.4) -9.2,6.4 ccw(c-9.25,6.4) -9.3,6.4
  lines w0.254: 11,-58.25 -11,-58.25 ; 11,-40.25 -11,-40.25 ; 11,-28.25 -11,-28.25 ; -11,-58.25 -11,-78.25 11,-78.25 11,1.75 -11,1.75 -11,-28.25 ; -11,-58.25 -11,-40.25 ; -11,-40.25 -11,-28.25
Mechanical 13:
  lines w0.2: -11,-2.275 -11,5 11,5 11,-2.275 -11,-2.275
  text "2230" at -2.6,-16.05 h1.52
  text "2242" at -2.8,-34.75 h1.52
  text "2260" at -2.9,-49.55 h1.52
  text "2280" at -3,-68.75 h1.52
Mechanical 15:
  lines w0.1: -11.25,-3.35 -11.25,6.4 11.3,6.4 11.3,-3.35 -11.25,-3.35
3D body "MDT275M02001.stp": height 2.85, standoff -5, extent -11,-3.02 11,6.02

## QFN45-MPM3695-10 [mm]
height 1.27
pads (53):
  rect 0.75x0.25 smd mask+0.051: 1(-3.7,3.25) 2(-3.7,2.6) 3(-3.7,1.95) 4(-3.7,1.3) 5(-3.7,0.65) 6(-3.7,0) 7(-3.7,-0.65) 8(-3.7,-1.3) 9(-3.7,-1.95) 10(-3.7,-2.6) 11(-3.7,-3.25) 23(3.7,-3.25) 24(3.7,-2.6) 25(3.7,-1.95) 26(3.7,-1.3) 27(3.7,-0.65) 28(3.7,0) 29(3.7,0.65) 30(3.7,1.3) 31(3.7,1.95) 32(3.7,2.6) 33(3.7,3.25)
  rect 0.3x0.4 smd rot 135.1 mask+0.051: 1(-3.461,3.407)
  rect 0.25x0.25 smd mask+0.051: 1(-3.3,3.25)
  rect 2.025x1.875 smd mask+0.051: 9(-2.688,-2.762) 19(2.688,-2.762)
  rect 0.25x0.75 smd mask+0.051: 12(-3.3,-3.7) 13(-2.8,-3.7) 14(-2.3,-3.7) 15(-1.8,-3.7) 16(-0.65,-3.7) 17(0,-3.7) 18(0.65,-3.7) 19(1.8,-3.7) 20(2.3,-3.7) 21(2.8,-3.7) 22(3.3,-3.7) 34(3.3,3.7) 35(2.8,3.7) 36(2.3,3.7) 37(1.8,3.7) 38(1.3,3.7) 39(0.65,3.7) 40(-0.65,3.7) 41(-1.3,3.7) 42(-1.8,3.7) 43(-2.3,3.7) 44(-2.8,3.7) 45(-3.3,3.7)
  rect 1.55x4.2 smd mask+0.051: 16(0,-1.6)
  rect 0.525x0.575 smd mask+0.051: 33(3.437,3.413)
  rect 0.9x2 smd mask+0.051: 38(0.975,2.7) 40(-0.975,2.7)
Top Overlay:
  lines w0.1: -4.15,-3.6 -4.15,-4.15 -3.6,-4.15 ; -4.149,3.55 -4.149,3.99 -3.99,4.148 -3.65,4.148 ; 3.65,-4.15 4.15,-4.15 4.15,-3.6 ; 3.65,4.15 4.15,4.15 4.15,3.6
Mechanical 15:
  lines w0.1: -4.15,-4.15 -4.15,4.151 4.15,4.151 4.15,-4.15 -4.15,-4.15
3D body "MPM3695-10.STEP": height 1.6, standoff -0.01, extent -4,-4 4,4

## QFN50P250X320X90-15N [mm]
pads (15):
  rect 0.5x0.3 smd: 1(-1.15,0.75) 2(-1.15,0.25) 3(-1.15,-0.25) 4(-1.15,-0.75) 8(1.15,-0.75) 9(1.15,-0.25) 10(1.15,0.25) 11(1.15,0.75)
  rect 0.3x0.5 smd: 5(-0.5,-1.5) 6(0,-1.5) 7(0.5,-1.5) 12(0.5,1.5) 13(0,1.5) 14(-0.5,1.5)
  rect 1.45x2.15 smd: 15(0,0)
Top Overlay:
  circle w0.25: c-1.55,1.8 r0.125
Mechanical 13:
  lines w0.1: -1.25,1.1 -0.75,1.6 ; -1.25,-1.6 -1.25,1.6 1.25,1.6 1.25,-1.6 -1.25,-1.6
Mechanical 15:
  lines w0.05: -1.55,-1.9 -1.55,1.9 1.55,1.9 1.55,-1.9 -1.55,-1.9
3D body "DSC557-0344FI0.stp": height 0.9, standoff 0, extent -1.3,-1.65 1.3,1.65